# Altium footprint library DrPCB.PcbLib: 910 footprints (part 48 of 57)
Each footprint in its own frame and in the unit in brackets; x right, y up, seen from the top. Pads: shape width x height; smd on the part's side, far side on the other; paste and mask are expansions set on the pad; w line width, h text height; cw(c..) or ccw(c..) is an arc to the next point about the centre after c.
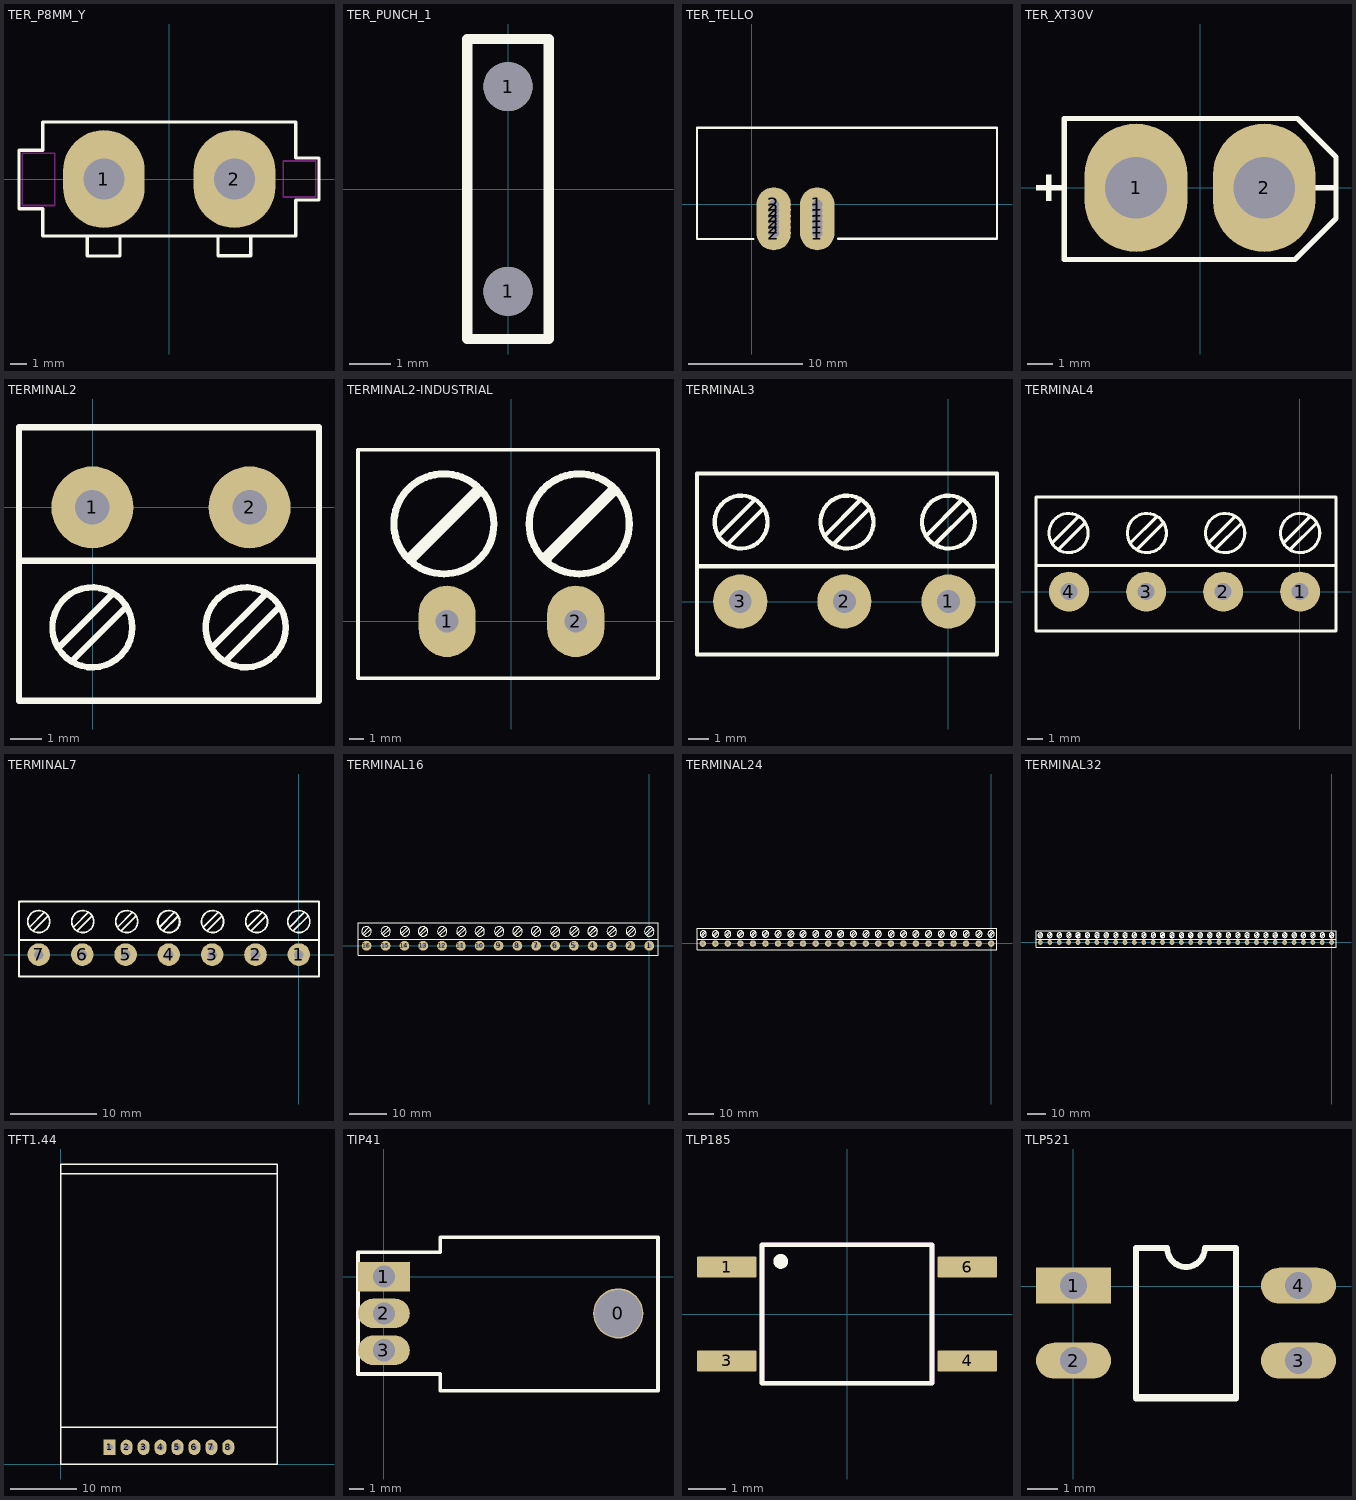
[diagram p47: the footprints below, top view; thin cyan lines are the x and y axes]

## TER_P8MM_Y [mm]
pads (2):
  oval 5x6 hole 2.5: 1(-4,0) 2(4,0)
Top Overlay:
  lines w0.2: -7.75,-1.839 -7.75,-3.5 7.75,-3.5 7.75,-1.292 ; -7.75,-1.816 -9.207,-1.816 -9.207,1.765 -7.75,1.765 ; -7.75,1.839 -7.75,3.5 7.75,3.5 7.75,1.292 ; -5.018,-3.531 -5.018,-4.725 -3.018,-4.725 -3.018,-3.531 ; 2.992,-3.505 2.992,-4.7 4.992,-4.7 4.992,-3.505 ; 7.75,-1.283 9.182,-1.283 9.182,1.283 7.75,1.283
Keep-Out Layer:
  lines w0.1: -9.018,-1.625 -7.018,-1.625 -7.018,1.575 -9.018,1.575 -9.018,-1.625 ; 6.992,-1.1 8.992,-1.1 8.992,1.1 6.992,1.1 6.992,-1.1
3D body: height 15.2, standoff 0, extent -7.747,-4.724 7.747,3.505
3D body: height 0.25, standoff 0, extent 7.391,3.162 7.391,3.162

## TER_PUNCH_1 [mm]
pads (2):
  round 1.2 / inner round 4 / far side round 4 hole 1.2: 1(0,-2.5) 1(0,2.5)
Top Overlay:
  lines w0.254: -0.997,-3.664 -0.997,3.664 0.997,3.664 0.997,-3.664 -0.997,-3.664

## TER_TELLO [mm]
pads (12):
  round 3 hole 0.9: 1(5.7,-2.5) 1(5.7,-2) 1(5.7,-1.5) 1(5.7,-1) 1(5.7,-0.5) 1(5.7,0) 2(1.9,-2.5) 2(1.9,-2) 2(1.9,-1.5) 2(1.9,-1) 2(1.9,-0.5) 2(1.9,0)
Top Overlay:
  lines w0.2: -4.8,-3 -4.8,6.7 21.4,6.7 21.4,-3 7.518,-3 ; -4.788,-3.023 0.14,-3.023
3D body: height 4, standoff 0, extent 5.427,-3.264 5.973,-0.165
3D body: height 4, standoff 0, extent 1.627,-3.264 2.173,-0.165

## TER_XT30V [mm] "BATTERY CONN XT30"
pads (2):
  oval 4x5 hole 2.4: 1(-2.5,0) 2(2.5,0)
Top Overlay:
  region: 5.2,-0.1 5.2,0.1 4.2,0.1 4.2,-0.1
  region: -5.8,0.5 -6,0.5 -6,-0.5 -5.8,-0.5
  region: -5.4,-0.1 -5.4,0.1 -6.4,0.1 -6.4,-0.1
  lines w0.2: -5.3,-2.8 3.7,-2.8 5.3,-1.2 5.3,1.2 3.8,2.7 -5.3,2.7 -5.3,-2.8
3D body "XT30.step": height 12.6, standoff -2.9, extent -5.2,-2.7 5.2,2.6

## TERMINAL2 [mm]
pads (2):
  round 2.6 hole 1.1: 1(-0.018,-0.01) 2(4.978,-0.01)
Top Overlay:
  circle w0.203: c4.851,-3.82 r1.27
  circle w0.203: c-0.018,-3.82 r1.27
  lines w0.203: -2.346,-1.704 7.179,-1.704 ; -1.076,-4.455 0.617,-2.762 ; -0.653,-4.879 1.041,-3.185 ; 3.792,-4.455 5.486,-2.762 ; 4.216,-4.879 5.909,-3.185 ; 7.179,2.523 7.179,-6.149 -2.346,-6.149 -2.346,2.529 7.179,2.53

## TERMINAL2-INDUSTRIAL [mm]
pads (2):
  oval 4x5 hole 1.6: 1(-4.5,0) 2(4.5,0)
Top Overlay:
  circle w0.5: c4.749,6.82 r3.5
  circle w0.5: c-4.726,6.82 r3.5
  lines w0.254: -7.195,4.242 -7.01,4.426 ; 2.28,4.28 2.464,4.464 ; -10.738,-3.988 10.262,-3.988 10.262,12.012 -10.738,12.012 -10.738,-3.988
  lines w0.8: -7.01,4.426 -7.01,4.451 -2.356,9.106 ; 2.464,4.464 2.464,4.489 7.118,9.144

## TERMINAL3 [mm]
pads (3):
  round 2.6 hole 1.1: 1(0.014,0.012) 2(-4.982,0.012) 3(-9.977,0.012)
Top Overlay:
  circle w0.203: c0.014,3.822 r1.27
  circle w0.203: c-4.855,3.822 r1.27
  circle w0.203: c-9.935,3.822 r1.27
  lines w0.203: -12.051,-2.528 2.342,-2.528 ; -12.051,-2.517 -12.051,6.151 2.342,6.151 2.342,-2.482 ; -12.051,1.706 2.342,1.706 ; -10.993,3.187 -9.3,4.881 ; -10.57,2.764 -8.876,4.457 ; -5.913,3.187 -4.22,4.881 ; -5.49,2.764 -3.796,4.457 ; -1.045,3.187 0.649,4.881 ; -0.621,2.764 1.072,4.457

## TERMINAL4 [mm]
pads (4):
  round 2.6 hole 1.1: 1(0.023,-0.008) 2(-4.973,-0.008) 3(-9.968,-0.008) 4(-14.985,-0.008)
Top Overlay:
  circle w0.203: c0.023,3.802 r1.27
  circle w0.203: c-4.846,3.802 r1.27
  circle w0.203: c-9.926,3.802 r1.27
  circle w0.203: c-15.006,3.802 r1.27
  lines w0.203: -17.122,-2.548 2.351,-2.548 ; -17.122,-2.543 -17.122,6.13 2.351,6.13 2.351,-2.543 ; -17.122,1.685 2.351,1.685 ; -16.064,3.167 -14.371,4.86 ; -15.641,2.744 -13.947,4.437 ; -10.984,3.167 -9.291,4.86 ; -10.561,2.744 -8.867,4.437 ; -5.904,3.167 -4.211,4.86 ; -5.481,2.744 -3.787,4.437 ; -1.036,3.167 0.658,4.86 ; -0.612,2.744 1.081,4.437

## TERMINAL7 [mm]
pads (7):
  round 2.6 hole 1.1: 1(0.023,-0.008) 2(-4.973,-0.008) 3(-9.968,-0.008) 4(-14.985,-0.008) 5(-19.959,-0.008) 6(-24.954,-0.008) 7(-29.971,-0.008)
Top Overlay:
  circle w0.203: c-14.963,3.802 r1.27
  circle w0.203: c-19.832,3.802 r1.27
  circle w0.203: c-24.912,3.802 r1.27
  circle w0.203: c-29.992,3.802 r1.27
  circle w0.203: c-15.006,3.802 r1.27
  circle w0.203: c-9.926,3.802 r1.27
  circle w0.203: c-4.846,3.802 r1.27
  circle w0.203: c0.023,3.802 r1.27
  lines w0.203: -32.258,-2.548 2.351,-2.548 ; -32.258,1.685 2.351,1.685 ; -32.131,6.13 2.351,6.13 2.351,-2.543 ; -31.05,3.167 -29.357,4.86 ; -30.627,2.744 -28.933,4.437 ; -25.97,3.167 -24.277,4.86 ; -25.547,2.744 -23.853,4.437 ; -20.89,3.167 -19.197,4.86 ; -20.467,2.744 -18.773,4.437 ; -16.064,3.167 -14.371,4.86 ; -16.022,3.167 -14.328,4.86 ; -15.641,2.744 -13.947,4.437 ; -15.598,2.744 -13.905,4.437 ; -10.984,3.167 -9.291,4.86 ; -10.561,2.744 -8.867,4.437 ; -5.904,3.167 -4.211,4.86 ; -5.481,2.744 -3.787,4.437 ; -1.036,3.167 0.658,4.86 ; -0.612,2.744 1.081,4.437
  lines w0.254: -32.258,-2.54 -32.258,6.096 -32.131,6.096

## TERMINAL16 [mm]
pads (16):
  round 2.6 hole 1.1: 1(0.023,-0.008) 2(-4.973,-0.008) 3(-9.968,-0.008) 4(-14.985,-0.008) 5(-19.959,-0.008) 6(-24.954,-0.008) 7(-29.971,-0.008) 8(-34.945,-0.008) 9(-39.94,-0.008) 10(-44.957,-0.008) 11(-49.931,-0.008) 12(-54.926,-0.008) 13(-59.921,-0.008) 14(-64.917,-0.008) 15(-69.912,-0.008) 16(-74.929,-0.008)
Top Overlay:
  circle w0.203: c-39.771,3.802 r1.27
  circle w0.203: c-34.902,3.802 r1.27
  circle w0.203: c-14.963,3.802 r1.27
  circle w0.203: c-19.832,3.802 r1.27
  circle w0.203: c-24.912,3.802 r1.27
  circle w0.203: c-29.992,3.802 r1.27
  circle w0.203: c-15.006,3.802 r1.27
  circle w0.203: c-9.926,3.802 r1.27
  circle w0.203: c-4.846,3.802 r1.27
  circle w0.203: c0.023,3.802 r1.27
  circle w0.203: c-44.935,3.802 r1.27
  circle w0.203: c-49.804,3.802 r1.27
  circle w0.203: c-54.884,3.802 r1.27
  circle w0.203: c-59.964,3.802 r1.27
  circle w0.203: c-74.95,3.802 r1.27
  circle w0.203: c-69.87,3.802 r1.27
  circle w0.203: c-64.79,3.802 r1.27
  circle w0.203: c-59.921,3.802 r1.27
  lines w0.203: -77.216,-2.548 -32.131,-2.548 ; -77.216,1.685 -42.607,1.685 ; -77.089,6.13 -32.131,6.13 2.351,6.13 2.351,-2.543 ; -76.008,3.167 -74.315,4.86 ; -75.585,2.744 -73.891,4.437 ; -70.928,3.167 -69.235,4.86 ; -70.505,2.744 -68.811,4.437 ; -65.848,3.167 -64.155,4.86 ; -65.425,2.744 -63.731,4.437 ; -61.022,3.167 -59.329,4.86 ; -60.98,3.167 -59.286,4.86 ; -60.599,2.744 -58.905,4.437 ; -60.556,2.744 -58.863,4.437 ; -55.942,3.167 -54.249,4.86 ; -55.519,2.744 -53.825,4.437 ; -50.862,3.167 -49.169,4.86 ; -50.439,2.744 -48.745,4.437 ; -45.994,3.167 -44.3,4.86 ; -45.57,2.744 -43.877,4.437 ; -42.926,1.685 2.351,1.685 ; -40.829,3.167 -39.136,4.86 ; -40.406,2.744 -38.712,4.437 ; -35.961,3.167 -34.267,4.86 ; -35.537,2.744 -33.844,4.437 ; -32.258,-2.548 2.351,-2.548 ; -31.05,3.167 -29.357,4.86 ; -30.627,2.744 -28.933,4.437 ; -25.97,3.167 -24.277,4.86 ; -25.547,2.744 -23.853,4.437 ; -20.89,3.167 -19.197,4.86 ; -20.467,2.744 -18.773,4.437 ; -16.064,3.167 -14.371,4.86 ; -16.022,3.167 -14.328,4.86 ; -15.641,2.744 -13.947,4.437 ; -15.598,2.744 -13.905,4.437 ; -10.984,3.167 -9.291,4.86 ; -10.561,2.744 -8.867,4.437 ; -5.904,3.167 -4.211,4.86 ; -5.481,2.744 -3.787,4.437 ; -1.036,3.167 0.658,4.86 ; -0.612,2.744 1.081,4.437
  lines w0.254: -77.216,-2.54 -77.216,6.096

## TERMINAL24 [mm]
pads (24):
  round 2.6 hole 1.1: 1(-0.003,-0.008) 2(-4.998,-0.008) 3(-9.993,-0.008) 4(-15.01,-0.008) 5(-19.984,-0.008) 6(-24.979,-0.008) 7(-29.996,-0.008) 8(-34.97,-0.008) 9(-39.965,-0.008) 10(-44.982,-0.008) 11(-49.956,-0.008) 12(-54.951,-0.008) 13(-59.947,-0.008) 14(-64.942,-0.008) 15(-69.937,-0.008) 16(-74.954,-0.008) 17(-79.928,-0.008) 18(-84.923,-0.008) 19(-89.94,-0.008) 20(-94.914,-0.008) 21(-99.909,-0.008) 22(-104.926,-0.008) 23(-109.9,-0.008) 24(-114.895,-0.008)
Top Overlay:
  circle w0.203: c-114.726,3.802 r1.27
  circle w0.203: c-109.858,3.802 r1.27
  circle w0.203: c-89.919,3.802 r1.27
  circle w0.203: c-94.787,3.802 r1.27
  circle w0.203: c-99.867,3.802 r1.27
  circle w0.203: c-104.947,3.802 r1.27
  circle w0.203: c-89.961,3.802 r1.27
  circle w0.203: c-84.881,3.802 r1.27
  circle w0.203: c-79.801,3.802 r1.27
  circle w0.203: c-74.933,3.802 r1.27
  circle w0.203: c-39.796,3.802 r1.27
  circle w0.203: c-34.928,3.802 r1.27
  circle w0.203: c-14.989,3.802 r1.27
  circle w0.203: c-19.857,3.802 r1.27
  circle w0.203: c-24.937,3.802 r1.27
  circle w0.203: c-30.017,3.802 r1.27
  circle w0.203: c-15.031,3.802 r1.27
  circle w0.203: c-9.951,3.802 r1.27
  circle w0.203: c-4.871,3.802 r1.27
  circle w0.203: c-0.003,3.802 r1.27
  circle w0.203: c-44.961,3.802 r1.27
  circle w0.203: c-49.829,3.802 r1.27
  circle w0.203: c-54.909,3.802 r1.27
  circle w0.203: c-59.989,3.802 r1.27
  circle w0.203: c-74.975,3.802 r1.27
  circle w0.203: c-69.895,3.802 r1.27
  circle w0.203: c-64.815,3.802 r1.27
  circle w0.203: c-59.947,3.802 r1.27
  lines w0.203: -117.221,6.13 -72.604,6.13 ; -117.21,-2.54 -117.21,6.121 ; -117.196,-2.548 -72.604,-2.548 ; -117.17,1.685 -72.604,1.685 ; -115.784,3.167 -114.091,4.86 ; -115.361,2.744 -113.668,4.437 ; -110.916,3.167 -109.223,4.86 ; -110.493,2.744 -108.799,4.437 ; -106.005,3.167 -104.312,4.86 ; -105.582,2.744 -103.889,4.437 ; -100.925,3.167 -99.232,4.86 ; -100.502,2.744 -98.809,4.437 ; -95.845,3.167 -94.152,4.86 ; -95.422,2.744 -93.729,4.437 ; -91.019,3.167 -89.326,4.86 ; -90.977,3.167 -89.284,4.86 ; -90.596,2.744 -88.903,4.437 ; -90.554,2.744 -88.86,4.437 ; -85.939,3.167 -84.246,4.86 ; -85.516,2.744 -83.823,4.437 ; -80.859,3.167 -79.166,4.86 ; -80.436,2.744 -78.743,4.437 ; -77.241,-2.548 -32.156,-2.548 ; -77.241,1.685 -42.632,1.685 ; -77.114,6.13 -32.156,6.13 2.326,6.13 2.326,-2.543 ; -76.033,3.167 -74.34,4.86 ; -75.991,3.167 -74.298,4.86 ; -75.61,2.744 -73.917,4.437 ; -75.568,2.744 -73.874,4.437 ; -70.953,3.167 -69.26,4.86 ; -70.53,2.744 -68.837,4.437 ; -65.873,3.167 -64.18,4.86 ; -65.45,2.744 -63.757,4.437 ; -61.047,3.167 -59.354,4.86 ; -61.005,3.167 -59.312,4.86 ; -60.624,2.744 -58.931,4.437 ; -60.582,2.744 -58.888,4.437 ; -55.967,3.167 -54.274,4.86 ; -55.544,2.744 -53.851,4.437 ; -50.887,3.167 -49.194,4.86 ; -50.464,2.744 -48.771,4.437 ; -46.019,3.167 -44.326,4.86 ; -45.596,2.744 -43.902,4.437 ; -42.951,1.685 2.326,1.685 ; -40.854,3.167 -39.161,4.86 ; -40.431,2.744 -38.738,4.437 ; -35.986,3.167 -34.293,4.86 ; -35.563,2.744 -33.869,4.437 ; -32.283,-2.548 2.326,-2.548 ; -31.075,3.167 -29.382,4.86 ; -30.652,2.744 -28.959,4.437 ; -25.995,3.167 -24.302,4.86 ; -25.572,2.744 -23.879,4.437 ; -20.915,3.167 -19.222,4.86 ; -20.492,2.744 -18.799,4.437 ; -16.089,3.167 -14.396,4.86 ; -16.047,3.167 -14.354,4.86 ; -15.666,2.744 -13.973,4.437 ; -15.624,2.744 -13.93,4.437 ; -11.009,3.167 -9.316,4.86 ; -10.586,2.744 -8.893,4.437 ; -5.929,3.167 -4.236,4.86 ; -5.506,2.744 -3.813,4.437 ; -1.061,3.167 0.632,4.86 ; -0.638,2.744 1.056,4.437

## TERMINAL32 [mm]
pads (32):
  round 2.6 hole 1.1: 1(0.023,-0.008) 2(-4.973,-0.008) 3(-9.968,-0.008) 4(-14.985,-0.008) 5(-19.959,-0.008) 6(-24.954,-0.008) 7(-29.971,-0.008) 8(-34.945,-0.008) 9(-39.94,-0.008) 10(-44.957,-0.008) 11(-49.931,-0.008) 12(-54.926,-0.008) 13(-59.921,-0.008) 14(-64.917,-0.008) 15(-69.912,-0.008) 16(-74.929,-0.008) 17(-79.903,-0.008) 18(-84.898,-0.008) 19(-89.915,-0.008) 20(-94.889,-0.008) 21(-99.884,-0.008) 22(-104.901,-0.008) 23(-109.875,-0.008) 24(-114.87,-0.008) 25(-119.887,-0.008) 26(-124.861,-0.008) 27(-129.856,-0.008) 28(-134.851,-0.008) 29(-139.847,-0.008) 30(-144.842,-0.008) 31(-149.859,-0.008) 32(-154.939,-0.008)
Top Overlay:
  circle w0.203: c-114.701,3.802 r1.27
  circle w0.203: c-109.832,3.802 r1.27
  circle w0.203: c-89.893,3.802 r1.27
  circle w0.203: c-94.762,3.802 r1.27
  circle w0.203: c-99.842,3.802 r1.27
  circle w0.203: c-104.922,3.802 r1.27
  circle w0.203: c-89.936,3.802 r1.27
  circle w0.203: c-84.856,3.802 r1.27
  circle w0.203: c-79.776,3.802 r1.27
  circle w0.203: c-74.907,3.802 r1.27
  circle w0.203: c-119.865,3.802 r1.27
  circle w0.203: c-124.734,3.802 r1.27
  circle w0.203: c-129.814,3.802 r1.27
  circle w0.203: c-134.894,3.802 r1.27
  circle w0.203: c-149.88,3.802 r1.27
  circle w0.203: c-144.8,3.802 r1.27
  circle w0.203: c-139.72,3.802 r1.27
  circle w0.203: c-134.851,3.802 r1.27
  circle w0.203: c-39.771,3.802 r1.27
  circle w0.203: c-34.902,3.802 r1.27
  circle w0.203: c-14.963,3.802 r1.27
  circle w0.203: c-19.832,3.802 r1.27
  circle w0.203: c-24.912,3.802 r1.27
  circle w0.203: c-29.992,3.802 r1.27
  circle w0.203: c-15.006,3.802 r1.27
  circle w0.203: c-9.926,3.802 r1.27
  circle w0.203: c-4.846,3.802 r1.27
  circle w0.203: c0.023,3.802 r1.27
  circle w0.203: c-44.935,3.802 r1.27
  circle w0.203: c-49.804,3.802 r1.27
  circle w0.203: c-54.884,3.802 r1.27
  circle w0.203: c-59.964,3.802 r1.27
  circle w0.203: c-74.95,3.802 r1.27
  circle w0.203: c-69.87,3.802 r1.27
  circle w0.203: c-64.79,3.802 r1.27
  circle w0.203: c-59.921,3.802 r1.27
  circle w0.203: c-149.88,3.802 r1.27
  circle w0.203: c-154.96,3.802 r1.27
  lines w0.203: -157.226,-2.548 -107.061,-2.548 ; -157.226,1.685 -117.537,1.685 ; -157.226,6.13 -107.061,6.13 -72.579,6.13 ; -156.018,3.167 -154.325,4.86 ; -155.595,2.744 -153.901,4.437 ; -145.858,3.167 -144.165,4.86 ; -145.435,2.744 -143.741,4.437 ; -140.778,3.167 -139.085,4.86 ; -140.355,2.744 -138.661,4.437 ; -135.952,3.167 -134.259,4.86 ; -135.91,3.167 -134.216,4.86 ; -135.529,2.744 -133.835,4.437 ; -135.486,2.744 -133.793,4.437 ; -130.872,3.167 -129.179,4.86 ; -130.449,2.744 -128.755,4.437 ; -125.792,3.167 -124.099,4.86 ; -125.369,2.744 -123.675,4.437 ; -120.924,3.167 -119.23,4.86 ; -120.5,2.744 -118.807,4.437 ; -117.856,1.685 -72.579,1.685 ; -115.759,3.167 -114.066,4.86 ; -115.336,2.744 -113.642,4.437 ; -110.891,3.167 -109.197,4.86 ; -110.467,2.744 -108.774,4.437 ; -107.188,-2.548 -72.579,-2.548 ; -105.98,3.167 -104.287,4.86 ; -105.557,2.744 -103.863,4.437 ; -100.9,3.167 -99.207,4.86 ; -100.477,2.744 -98.783,4.437 ; -95.82,3.167 -94.127,4.86 ; -95.397,2.744 -93.703,4.437 ; -90.994,3.167 -89.301,4.86 ; -90.952,3.167 -89.258,4.86 ; -90.571,2.744 -88.877,4.437 ; -90.528,2.744 -88.835,4.437 ; -85.914,3.167 -84.221,4.86 ; -85.491,2.744 -83.797,4.437 ; -80.834,3.167 -79.141,4.86 ; -80.411,2.744 -78.717,4.437 ; -77.216,-2.548 -32.131,-2.548 ; -77.216,1.685 -42.607,1.685 ; -77.089,6.13 -32.131,6.13 2.351,6.13 2.351,-2.543 ; -76.008,3.167 -74.315,4.86 ; -75.966,3.167 -74.272,4.86 ; -75.585,2.744 -73.891,4.437 ; -75.542,2.744 -73.849,4.437 ; -70.928,3.167 -69.235,4.86 ; -70.505,2.744 -68.811,4.437 ; -65.848,3.167 -64.155,4.86 ; -65.425,2.744 -63.731,4.437 ; -61.022,3.167 -59.329,4.86 ; -60.98,3.167 -59.286,4.86 ; -60.599,2.744 -58.905,4.437 ; -60.556,2.744 -58.863,4.437 ; -55.942,3.167 -54.249,4.86 ; -55.519,2.744 -53.825,4.437 ; -50.862,3.167 -49.169,4.86 ; -50.439,2.744 -48.745,4.437 ; -45.994,3.167 -44.3,4.86 ; -45.57,2.744 -43.877,4.437 ; -42.926,1.685 2.351,1.685 ; -40.829,3.167 -39.136,4.86 ; -40.406,2.744 -38.712,4.437 ; -35.961,3.167 -34.267,4.86 ; -35.537,2.744 -33.844,4.437 ; -32.258,-2.548 2.351,-2.548 ; -31.05,3.167 -29.357,4.86 ; -30.627,2.744 -28.933,4.437 ; -25.97,3.167 -24.277,4.86 ; -25.547,2.744 -23.853,4.437 ; -20.89,3.167 -19.197,4.86 ; -20.467,2.744 -18.773,4.437 ; -16.064,3.167 -14.371,4.86 ; -16.022,3.167 -14.328,4.86 ; -15.641,2.744 -13.947,4.437 ; -15.598,2.744 -13.905,4.437 ; -10.984,3.167 -9.291,4.86 ; -10.561,2.744 -8.867,4.437 ; -5.904,3.167 -4.211,4.86 ; -5.481,2.744 -3.787,4.437 ; -1.036,3.167 0.658,4.86 ; -0.612,2.744 1.081,4.437 ; -150.938,3.167 -149.245,4.86 -150.938,3.167 ; -150.515,2.744 -148.821,4.437 -150.515,2.744
  lines w0.254: -157.226,-2.54 -157.226,6.096

## TFT1.44 [mm]
pads (8):
  rect 1.8x2.3 hole 1: 1(7.31,2.5)
  oval 1.8x2.3 hole 1: 2(9.85,2.5) 3(12.39,2.5) 4(14.93,2.5) 5(17.47,2.5) 6(20.01,2.5) 7(22.55,2.5) 8(25.09,2.5)
Top Overlay:
  lines w0.2: 0,5.5 32.4,5.5 ; 0,43.5 32.4,43.5 ; 0,0 32.4,0 32.4,45 0,45 0,0
3D body "1.44in SPI LCD Module - No Glass.STEP": height 4.33, standoff 0.01, extent -0.043,-0.137 32.443,45.1

## TIP41 [mm]
pads (4):
  round 3.4 hole 3.2: 0(15.875,-2.502)
  rect 3.5x2 hole 1.5: 1(0,0)
  oval 3.5x2 hole 1.5: 2(0,-2.5) 3(0,-5)
Top Overlay:
  lines w0.254: -1.759,-6.604 3.81,-6.604 3.81,-7.747 18.567,-7.747 18.567,2.667 3.81,2.667 3.81,1.651 -1.759,1.651 -1.759,-6.604

## TLP185 [mm]
pads (4):
  rrect14% 1.61x0.57 smd: 1(-3.25,1.27) 3(-3.25,-1.27) 4(3.25,-1.27) 6(3.25,1.27)
Top Overlay:
  circle w0.2: c-1.791,1.422 r0.1
  lines w0.127: -2.3,-1.875 -2.3,1.875 2.3,1.875 2.3,-1.875 -2.3,-1.875
Mechanical 13:
  circle w0.2: c-3.75,1.25 r0.1
  lines w0.127: -2.3,-1.875 -2.3,1.875 2.3,1.875 2.3,-1.875 -2.3,-1.875
3D body "User Library-TLP185.step": height 2.2, standoff 0, extent -3.514,-1.9 3.514,1.9

## TLP521 [mm]
pads (4):
  rect 2.5x1.2 hole 0.9: 1(0.011,0.018)
  oval 2.5x1.2 hole 0.9: 2(0.011,-2.482) 3(7.511,-2.482) 4(7.511,0.018)
Top Overlay:
  lines w0.2: 2.096,-3.744 2.096,1.268 3.136,1.268 ccw(c3.761,1.268) 4.386,1.268 5.426,1.268 5.426,-3.746
  lines w0.254: 2.125,-3.718 5.396,-3.718